# Altium footprint library 4.04-IDC-2.54mm贴片简牛插座.PcbLib: 24 footprints (part 1 of 2)
Each footprint in its own frame and in the unit in brackets; x right, y up, seen from the top. Pads: shape width x height; smd on the part's side, far side on the other; paste and mask are expansions set on the pad; w line width, h text height; cw(c..) or ccw(c..) is an arc to the next point about the centre after c.
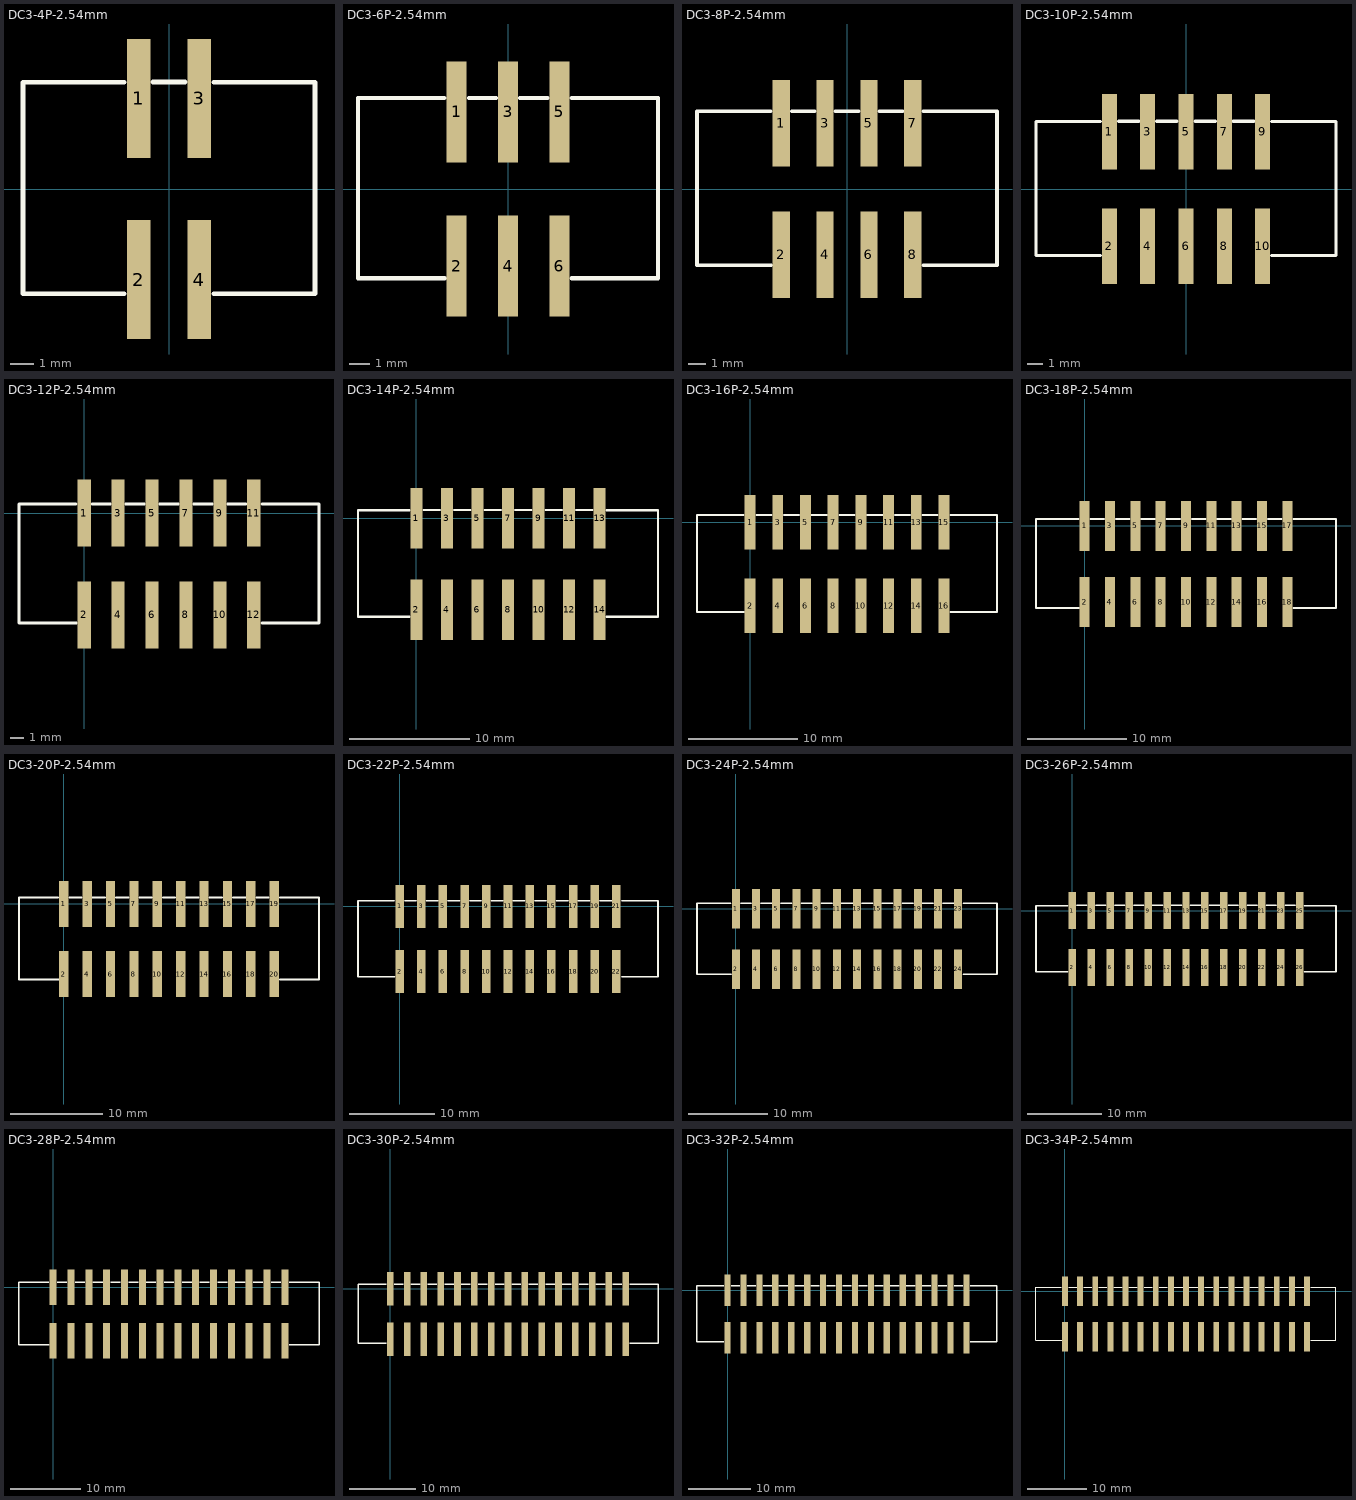
[diagram p0: the footprints below, top view; thin cyan lines are the x and y axes]

## DC3-4P-2.54mm [mm] "简牛贴片 2.54间距      [ PCB学习群514746572 ]"
height 10.2
pads (4):
  rect 1x5 smd: 1(-1.27,3.81) 2(-1.27,-3.81) 3(1.27,3.81) 4(1.27,-3.81)
Top Overlay:
  lines w0.203: -1.88,-4.41 -6.14,-4.41 -6.14,4.49 -1.88,4.49 ; -0.686,4.496 0.686,4.496 ; 1.88,-4.41 6.14,-4.41 6.14,4.49 1.88,4.49
3D body "IDC_SMD.STEP": height 9.99, standoff -0.01, extent -6.14,-5.72 6.14,5.72

## DC3-6P-2.54mm [mm] "简牛贴片 2.54间距      [ PCB学习群514746572 ]"
height 10.2
pads (6):
  rect 1x5 smd: 1(-2.54,3.81) 2(-2.54,-3.81) 3(0,3.81) 4(0,-3.81) 5(2.54,3.81) 6(2.54,-3.81)
Top Overlay:
  lines w0.203: -3.15,4.49 -7.41,4.49 -7.41,-4.41 -3.124,-4.41 ; -1.93,4.496 -0.584,4.496 ; 0.584,4.496 1.956,4.496 ; 3.15,-4.41 7.41,-4.41 7.41,4.49 3.15,4.49
3D body "IDC_SMD6.STEP": height 9.99, standoff -0.01, extent -7.41,-5.72 7.41,5.72

## DC3-8P-2.54mm [mm] "简牛贴片 2.54间距      [ PCB学习群514746572 ]"
height 10.2
pads (8):
  rect 1x5 smd: 1(-3.81,3.81) 2(-3.81,-3.81) 3(-1.27,3.81) 4(-1.27,-3.81) 5(1.27,3.81) 6(1.27,-3.81) 7(3.81,3.81) 8(3.81,-3.81)
Top Overlay:
  lines w0.203: -4.42,4.49 -8.68,4.49 -8.68,-4.41 -4.394,-4.41 ; -3.2,4.496 -1.854,4.496 ; -0.686,4.496 0.686,4.496 ; 1.854,4.496 3.226,4.496 ; 4.42,-4.41 8.68,-4.41 8.68,4.49 4.42,4.49
3D body "IDC_SMD8.STEP": height 9.99, standoff -0.01, extent -8.68,-5.72 8.68,5.72

## DC3-10P-2.54mm [mm] "简牛贴片 2.54间距      [ PCB学习群514746572 ]"
height 10.2
pads (10):
  rect 1x5 smd: 1(-5.08,3.81) 2(-5.08,-3.81) 3(-2.54,3.81) 4(-2.54,-3.81) 5(0,3.81) 6(0,-3.81) 7(2.54,3.81) 8(2.54,-3.81) 9(5.08,3.81) 10(5.08,-3.81)
Top Overlay:
  lines w0.203: -5.69,4.49 -9.95,4.49 -9.95,-4.41 -5.664,-4.41 ; -4.47,4.496 -3.124,4.496 ; -1.956,4.496 -0.584,4.496 ; 0.584,4.496 1.956,4.496 ; 3.124,4.496 4.496,4.496 ; 5.69,-4.41 9.95,-4.41 9.95,4.49 5.69,4.49
3D body "IDC_SMD10.STEP": height -0.42, standoff -10.42, extent -9.95,-5.72 9.95,5.72

## DC3-12P-2.54mm [mm] "简牛贴片 2.54间距      [ PCB学习群514746572 ]"
height 10.2
pads (12):
  rect 1x5 smd: 1(0,0) 2(0,-7.62) 3(2.54,0) 4(2.54,-7.62) 5(5.08,0) 6(5.08,-7.62) 7(7.62,0) 8(7.62,-7.62) 9(10.16,0) 10(10.16,-7.62) 11(12.7,0) 12(12.7,-7.62)
Top Overlay:
  lines w0.203: -0.61,0.68 -4.87,0.68 -4.87,-8.22 -0.584,-8.22 ; 0.61,0.686 1.956,0.686 ; 3.124,0.686 4.496,0.686 ; 5.664,0.686 7.036,0.686 ; 8.204,0.686 9.576,0.686 ; 10.744,0.686 12.116,0.686 ; 13.31,-8.22 17.57,-8.22 17.57,0.68 13.31,0.68
3D body "IDC_SMD12.STEP": height -0.42, standoff -10.42, extent -4.87,-9.53 17.57,1.91

## DC3-14P-2.54mm [mm] "简牛贴片 2.54间距      [ PCB学习群514746572 ]"
height 10.2
pads (14):
  rect 1x5 smd: 1(0,0) 2(0,-7.62) 3(2.54,0) 4(2.54,-7.62) 5(5.08,0) 6(5.08,-7.62) 7(7.62,0) 8(7.62,-7.62) 9(10.16,0) 10(10.16,-7.62) 11(12.7,0) 12(12.7,-7.62) 13(15.24,0) 14(15.24,-7.62)
Top Overlay:
  lines w0.203: -0.61,0.68 -4.87,0.68 -4.87,-8.22 -0.584,-8.22 ; 0.61,0.686 1.956,0.686 ; 3.124,0.686 4.496,0.686 ; 5.664,0.686 7.036,0.686 ; 8.204,0.686 9.576,0.686 ; 10.744,0.686 12.116,0.686 ; 13.284,0.686 14.656,0.686 ; 15.85,-8.22 20.11,-8.22 20.11,0.68 15.85,0.68
3D body "IDC_SMD14.STEP": height -0.42, standoff -10.42, extent -4.87,-9.53 20.11,1.91

## DC3-16P-2.54mm [mm] "简牛贴片 2.54间距      [ PCB学习群514746572 ]"
height 10.2
pads (16):
  rect 1x5 smd: 1(0,0) 2(0,-7.62) 3(2.54,0) 4(2.54,-7.62) 5(5.08,0) 6(5.08,-7.62) 7(7.62,0) 8(7.62,-7.62) 9(10.16,0) 10(10.16,-7.62) 11(12.7,0) 12(12.7,-7.62) 13(15.24,0) 14(15.24,-7.62) 15(17.78,0) 16(17.78,-7.62)
Top Overlay:
  lines w0.203: -0.61,0.68 -4.87,0.68 -4.87,-8.22 -0.584,-8.22 ; 0.61,0.686 1.956,0.686 ; 3.124,0.686 4.496,0.686 ; 5.664,0.686 7.036,0.686 ; 8.204,0.686 9.576,0.686 ; 10.744,0.686 12.116,0.686 ; 13.284,0.686 14.656,0.686 ; 15.824,0.686 17.196,0.686 ; 18.39,-8.22 22.65,-8.22 22.65,0.68 18.39,0.68
3D body "IDC_SMD16.STEP": height 9.99, standoff -0.01, extent -4.87,-9.53 22.65,1.91

## DC3-18P-2.54mm [mm] "简牛贴片 2.54间距      [ PCB学习群514746572 ]"
height 10.2
pads (18):
  rect 1x5 smd: 1(0,0) 2(0,-7.62) 3(2.54,0) 4(2.54,-7.62) 5(5.08,0) 6(5.08,-7.62) 7(7.62,0) 8(7.62,-7.62) 9(10.16,0) 10(10.16,-7.62) 11(12.7,0) 12(12.7,-7.62) 13(15.24,0) 14(15.24,-7.62) 15(17.78,0) 16(17.78,-7.62) 17(20.32,0) 18(20.32,-7.62)
Top Overlay:
  lines w0.203: -0.61,0.68 -4.87,0.68 -4.87,-8.22 -0.584,-8.22 ; 0.61,0.686 1.956,0.686 ; 3.124,0.686 4.496,0.686 ; 5.664,0.686 7.036,0.686 ; 8.204,0.686 9.576,0.686 ; 10.744,0.686 12.116,0.686 ; 13.284,0.686 14.656,0.686 ; 15.824,0.686 17.196,0.686 ; 18.364,0.686 19.736,0.686 ; 20.93,-8.22 25.19,-8.22 25.19,0.68 20.93,0.68
3D body "IDC_SMD18.STEP": height 9.99, standoff -0.01, extent -4.87,-9.53 25.19,1.91

## DC3-20P-2.54mm [mm] "简牛贴片 2.54间距      [ PCB学习群514746572 ]"
height 10.2
pads (20):
  rect 1x5 smd: 1(0,0) 2(0,-7.62) 3(2.54,0) 4(2.54,-7.62) 5(5.08,0) 6(5.08,-7.62) 7(7.62,0) 8(7.62,-7.62) 9(10.16,0) 10(10.16,-7.62) 11(12.7,0) 12(12.7,-7.62) 13(15.24,0) 14(15.24,-7.62) 15(17.78,0) 16(17.78,-7.62) 17(20.32,0) 18(20.32,-7.62) 19(22.86,0) 20(22.86,-7.62)
Top Overlay:
  lines w0.203: -0.61,0.68 -4.87,0.68 -4.87,-8.22 -0.584,-8.22 ; 0.61,0.686 1.956,0.686 ; 3.124,0.686 4.496,0.686 ; 5.664,0.686 7.036,0.686 ; 8.204,0.686 9.576,0.686 ; 10.744,0.686 12.116,0.686 ; 13.284,0.686 14.656,0.686 ; 15.824,0.686 17.196,0.686 ; 18.364,0.686 19.736,0.686 ; 20.904,0.686 22.276,0.686 ; 23.47,-8.22 27.73,-8.22 27.73,0.68 23.47,0.68
3D body "IDC_SMD20.STEP": height 9.99, standoff -0.01, extent -4.87,-9.53 27.73,1.91

## DC3-22P-2.54mm [mm] "简牛贴片 2.54间距      [ PCB学习群514746572 ]"
height 10.2
pads (22):
  rect 1x5 smd: 1(0,0) 2(0,-7.62) 3(2.54,0) 4(2.54,-7.62) 5(5.08,0) 6(5.08,-7.62) 7(7.62,0) 8(7.62,-7.62) 9(10.16,0) 10(10.16,-7.62) 11(12.7,0) 12(12.7,-7.62) 13(15.24,0) 14(15.24,-7.62) 15(17.78,0) 16(17.78,-7.62) 17(20.32,0) 18(20.32,-7.62) 19(22.86,0) 20(22.86,-7.62) 21(25.4,0) 22(25.4,-7.62)
Top Overlay:
  lines w0.203: -0.61,0.68 -4.87,0.68 -4.87,-8.22 -0.584,-8.22 ; 0.61,0.686 1.956,0.686 ; 3.124,0.686 4.496,0.686 ; 5.664,0.686 7.036,0.686 ; 8.204,0.686 9.576,0.686 ; 10.744,0.686 12.116,0.686 ; 13.284,0.686 14.656,0.686 ; 15.824,0.686 17.196,0.686 ; 18.364,0.686 19.736,0.686 ; 20.904,0.686 22.276,0.686 ; 23.444,0.686 24.816,0.686 ; 26.01,-8.22 30.27,-8.22 30.27,0.68 26.01,0.68
3D body "IDC_SMD22.STEP": height 9.99, standoff -0.01, extent -4.87,-9.53 30.27,1.91

## DC3-24P-2.54mm [mm] "简牛贴片 2.54间距      [ PCB学习群514746572 ]"
height 10.2
pads (24):
  rect 1x5 smd: 1(0,0) 2(0,-7.62) 3(2.54,0) 4(2.54,-7.62) 5(5.08,0) 6(5.08,-7.62) 7(7.62,0) 8(7.62,-7.62) 9(10.16,0) 10(10.16,-7.62) 11(12.7,0) 12(12.7,-7.62) 13(15.24,0) 14(15.24,-7.62) 15(17.78,0) 16(17.78,-7.62) 17(20.32,0) 18(20.32,-7.62) 19(22.86,0) 20(22.86,-7.62) 21(25.4,0) 22(25.4,-7.62) 23(27.94,0) 24(27.94,-7.62)
Top Overlay:
  lines w0.203: -0.61,0.68 -4.87,0.68 -4.87,-8.22 -0.584,-8.22 ; 0.61,0.686 1.956,0.686 ; 3.124,0.686 4.496,0.686 ; 5.664,0.686 7.036,0.686 ; 8.204,0.686 9.576,0.686 ; 10.744,0.686 12.116,0.686 ; 13.284,0.686 14.656,0.686 ; 15.824,0.686 17.196,0.686 ; 18.364,0.686 19.736,0.686 ; 20.904,0.686 22.276,0.686 ; 23.444,0.686 24.816,0.686 ; 25.984,0.686 27.356,0.686 ; 28.55,-8.22 32.81,-8.22 32.81,0.68 28.55,0.68
3D body "IDC_SMD24.STEP": height 9.99, standoff -0.01, extent -4.87,-9.53 32.81,1.91

## DC3-26P-2.54mm [mm] "简牛贴片 2.54间距      [ PCB学习群514746572 ]"
height 10.2
pads (26):
  rect 1x5 smd: 1(0,0) 2(0,-7.62) 3(2.54,0) 4(2.54,-7.62) 5(5.08,0) 6(5.08,-7.62) 7(7.62,0) 8(7.62,-7.62) 9(10.16,0) 10(10.16,-7.62) 11(12.7,0) 12(12.7,-7.62) 13(15.24,0) 14(15.24,-7.62) 15(17.78,0) 16(17.78,-7.62) 17(20.32,0) 18(20.32,-7.62) 19(22.86,0) 20(22.86,-7.62) 21(25.4,0) 22(25.4,-7.62) 23(27.94,0) 24(27.94,-7.62) 25(30.48,0) 26(30.48,-7.62)
Top Overlay:
  lines w0.203: -0.61,0.68 -4.87,0.68 -4.87,-8.22 -0.584,-8.22 ; 0.61,0.686 1.956,0.686 ; 3.124,0.686 4.496,0.686 ; 5.664,0.686 7.036,0.686 ; 8.204,0.686 9.576,0.686 ; 10.744,0.686 12.116,0.686 ; 13.284,0.686 14.656,0.686 ; 15.824,0.686 17.196,0.686 ; 18.364,0.686 19.736,0.686 ; 20.904,0.686 22.276,0.686 ; 23.444,0.686 24.816,0.686 ; 25.984,0.686 27.356,0.686 ; 28.524,0.686 29.896,0.686 ; 31.09,-8.22 35.35,-8.22 35.35,0.68 31.09,0.68
3D body "IDC_SMD26.STEP": height 9.99, standoff -0.01, extent -4.87,-9.53 35.35,1.91

## DC3-28P-2.54mm [mm] "简牛贴片 2.54间距      [ PCB学习群514746572 ]"
height 10.2
pads (28):
  rect 1x5 smd: 1(0,0) 2(0,-7.62) 3(2.54,0) 4(2.54,-7.62) 5(5.08,0) 6(5.08,-7.62) 7(7.62,0) 8(7.62,-7.62) 9(10.16,0) 10(10.16,-7.62) 11(12.7,0) 12(12.7,-7.62) 13(15.24,0) 14(15.24,-7.62) 15(17.78,0) 16(17.78,-7.62) 17(20.32,0) 18(20.32,-7.62) 19(22.86,0) 20(22.86,-7.62) 21(25.4,0) 22(25.4,-7.62) 23(27.94,0) 24(27.94,-7.62) 25(30.48,0) 26(30.48,-7.62) 27(33.02,0) 28(33.02,-7.62)
Top Overlay:
  lines w0.203: -0.61,0.68 -4.87,0.68 -4.87,-8.22 -0.584,-8.22 ; 0.61,0.686 1.956,0.686 ; 3.124,0.686 4.496,0.686 ; 5.664,0.686 7.036,0.686 ; 8.204,0.686 9.576,0.686 ; 10.744,0.686 12.116,0.686 ; 13.284,0.686 14.656,0.686 ; 15.824,0.686 17.196,0.686 ; 18.364,0.686 19.736,0.686 ; 20.904,0.686 22.276,0.686 ; 23.444,0.686 24.816,0.686 ; 25.984,0.686 27.356,0.686 ; 28.524,0.686 29.896,0.686 ; 31.064,0.686 32.436,0.686 ; 33.63,-8.22 37.89,-8.22 37.89,0.68 33.63,0.68
3D body "IDC_SMD28.STEP": height 9.99, standoff -0.01, extent -4.87,-9.53 37.89,1.91

## DC3-30P-2.54mm [mm] "简牛贴片 2.54间距      [ PCB学习群514746572 ]"
height 10.2
pads (30):
  rect 1x5 smd: 1(0,0) 2(0,-7.62) 3(2.54,0) 4(2.54,-7.62) 5(5.08,0) 6(5.08,-7.62) 7(7.62,0) 8(7.62,-7.62) 9(10.16,0) 10(10.16,-7.62) 11(12.7,0) 12(12.7,-7.62) 13(15.24,0) 14(15.24,-7.62) 15(17.78,0) 16(17.78,-7.62) 17(20.32,0) 18(20.32,-7.62) 19(22.86,0) 20(22.86,-7.62) 21(25.4,0) 22(25.4,-7.62) 23(27.94,0) 24(27.94,-7.62) 25(30.48,0) 26(30.48,-7.62) 27(33.02,0) 28(33.02,-7.62) 29(35.56,0) 30(35.56,-7.62)
Top Overlay:
  lines w0.203: -0.61,0.68 -4.87,0.68 -4.87,-8.22 -0.584,-8.22 ; 0.61,0.686 1.956,0.686 ; 3.124,0.686 4.496,0.686 ; 5.664,0.686 7.036,0.686 ; 8.204,0.686 9.576,0.686 ; 10.744,0.686 12.116,0.686 ; 13.284,0.686 14.656,0.686 ; 15.824,0.686 17.196,0.686 ; 18.364,0.686 19.736,0.686 ; 20.904,0.686 22.276,0.686 ; 23.444,0.686 24.816,0.686 ; 25.984,0.686 27.356,0.686 ; 28.524,0.686 29.896,0.686 ; 31.064,0.686 32.436,0.686 ; 33.604,0.686 34.976,0.686 ; 36.17,-8.22 40.43,-8.22 40.43,0.68 36.17,0.68
3D body "IDC_SMD30.STEP": height 9.99, standoff -0.01, extent -4.87,-9.53 40.43,1.91

## DC3-32P-2.54mm [mm] "简牛贴片 2.54间距      [ PCB学习群514746572 ]"
height 10.2
pads (32):
  rect 1x5 smd: 1(0,0) 2(0,-7.62) 3(2.54,0) 4(2.54,-7.62) 5(5.08,0) 6(5.08,-7.62) 7(7.62,0) 8(7.62,-7.62) 9(10.16,0) 10(10.16,-7.62) 11(12.7,0) 12(12.7,-7.62) 13(15.24,0) 14(15.24,-7.62) 15(17.78,0) 16(17.78,-7.62) 17(20.32,0) 18(20.32,-7.62) 19(22.86,0) 20(22.86,-7.62) 21(25.4,0) 22(25.4,-7.62) 23(27.94,0) 24(27.94,-7.62) 25(30.48,0) 26(30.48,-7.62) 27(33.02,0) 28(33.02,-7.62) 29(35.56,0) 30(35.56,-7.62) 31(38.1,0) 32(38.1,-7.62)
Top Overlay:
  lines w0.203: -0.61,0.68 -4.87,0.68 -4.87,-8.22 -0.584,-8.22 ; 0.61,0.686 1.956,0.686 ; 3.124,0.686 4.496,0.686 ; 5.664,0.686 7.036,0.686 ; 8.204,0.686 9.576,0.686 ; 10.744,0.686 12.116,0.686 ; 13.284,0.686 14.656,0.686 ; 15.824,0.686 17.196,0.686 ; 18.364,0.686 19.736,0.686 ; 20.904,0.686 22.276,0.686 ; 23.444,0.686 24.816,0.686 ; 25.984,0.686 27.356,0.686 ; 28.524,0.686 29.896,0.686 ; 31.064,0.686 32.436,0.686 ; 33.604,0.686 34.976,0.686 ; 36.144,0.686 37.516,0.686 ; 38.71,-8.22 42.97,-8.22 42.97,0.68 38.71,0.68
3D body "IDC_SMD32.STEP": height -0.42, standoff -10.42, extent -4.87,-9.53 42.97,1.91

## DC3-34P-2.54mm [mm] "简牛贴片 2.54间距      [ PCB学习群514746572 ]"
height 10.2
pads (34):
  rect 1x5 smd: 1(0,0) 2(0,-7.62) 3(2.54,0) 4(2.54,-7.62) 5(5.08,0) 6(5.08,-7.62) 7(7.62,0) 8(7.62,-7.62) 9(10.16,0) 10(10.16,-7.62) 11(12.7,0) 12(12.7,-7.62) 13(15.24,0) 14(15.24,-7.62) 15(17.78,0) 16(17.78,-7.62) 17(20.32,0) 18(20.32,-7.62) 19(22.86,0) 20(22.86,-7.62) 21(25.4,0) 22(25.4,-7.62) 23(27.94,0) 24(27.94,-7.62) 25(30.48,0) 26(30.48,-7.62) 27(33.02,0) 28(33.02,-7.62) 29(35.56,0) 30(35.56,-7.62) 31(38.1,0) 32(38.1,-7.62) 33(40.64,0) 34(40.64,-7.62)
Top Overlay:
  lines w0.203: -0.61,0.68 -4.87,0.68 -4.87,-8.22 -0.584,-8.22 ; 0.61,0.686 1.956,0.686 ; 3.124,0.686 4.496,0.686 ; 5.664,0.686 7.036,0.686 ; 8.204,0.686 9.576,0.686 ; 10.744,0.686 12.116,0.686 ; 13.284,0.686 14.656,0.686 ; 15.824,0.686 17.196,0.686 ; 18.364,0.686 19.736,0.686 ; 20.904,0.686 22.276,0.686 ; 23.444,0.686 24.816,0.686 ; 25.984,0.686 27.356,0.686 ; 28.524,0.686 29.896,0.686 ; 31.064,0.686 32.436,0.686 ; 33.604,0.686 34.976,0.686 ; 36.144,0.686 37.516,0.686 ; 38.684,0.686 40.056,0.686 ; 41.25,-8.22 45.51,-8.22 45.51,0.68 41.25,0.68
3D body "IDC_SMD34.STEP": height 9.99, standoff -0.01, extent -4.87,-9.53 45.51,1.91